# Altium schematic symbol library jlcpcb_2025_04_capacitors_extended_0603.schlib: 3668 symbols (part 14 of 20) (continued)
## CL10F473ZB8NNNC
designator C?  Capacitance: 47nF  (hidden comment: *)
Capacitor, Ceramic (MLCC), 47nF, 50V, Y5V, SMD 0603; Manufacturer: Samsung Electro-Mechanics; Manufacturer Part Number: CL10F473ZB8NNNC; Temperature Rating: -20%~+80%; Package Size: 0603; JLCPCB Basic Part: No; JLCPCB Part Number: C170123; Supplier 1: LCSC; Category: Capacitors - MLCC; Supplier Part Number 1: C170123; Voltage Rating: 50V; Temperature Coefficient: Y5V; RoHS: Yes; ComponentLink1Description: Datasheet; ComponentLink1URL: https://wmsc.lcsc.com/wmsc/upload/file/pdf/v2/lcsc/2304140030_Samsung-Electro-Mechanics-CL10F473ZB8NNNC_C170123.pdf; ComponentLink2Description: JLCPCB Part URL; ComponentLink2URL: https://jlcpcb.com/partdetail/C170123; ComponentLink3Description: LCSC Part URL; ComponentLink3URL: https://lcsc.com/product-detail/Multilayer-Ceramic-Capacitors-MLCC---SMD-SMT_Samsung-Electro-Mechanics-Samsung-Electro-Mechanics-CL10F473ZB8NNNC_C170123.html; ComponentLink4Description: Samsung Component Library; ComponentLink4URL: https://weblib.samsungsem.com/mlcc/mlcc-ec.do?partNumber=CL10F473ZB8NNN
footprint CAP-0603 (0603 (1608M) Capacitor)
pins: 1, 2

## CL10F474ZA8NNNC
designator C?  Capacitance: 470nF  (hidden comment: *)
Capacitor, Ceramic (MLCC), 470nF, 25V, Y5V, SMD 0603; Manufacturer: Samsung Electro-Mechanics; Manufacturer Part Number: CL10F474ZA8NNNC; Temperature Rating: -20%~+80%; Package Size: 0603; JLCPCB Basic Part: No; JLCPCB Part Number: C318649; Supplier 1: LCSC; Category: Capacitors - MLCC; Supplier Part Number 1: C318649; Voltage Rating: 25V; Temperature Coefficient: Y5V; RoHS: Yes; ComponentLink1Description: Datasheet; ComponentLink1URL: https://wmsc.lcsc.com/wmsc/upload/file/pdf/v2/lcsc/1912111437_Samsung-Electro-Mechanics-CL10F474ZA8NNNC_C318649.pdf; ComponentLink2Description: JLCPCB Part URL; ComponentLink2URL: https://jlcpcb.com/partdetail/C318649; ComponentLink3Description: LCSC Part URL; ComponentLink3URL: https://lcsc.com/product-detail/Multilayer-Ceramic-Capacitors-MLCC---SMD-SMT_Samsung-Electro-Mechanics-Samsung-Electro-Mechanics-CL10F474ZA8NNNC_C318649.html; ComponentLink4Description: Samsung Component Library; ComponentLink4URL: https://weblib.samsungsem.com/mlcc/mlcc-ec.do?partNumber=CL10F474ZA8NNN
footprint CAP-0603 (0603 (1608M) Capacitor)
pins: 1, 2

## CL10F474ZB8NNNC
designator C?  Capacitance: 470nF  (hidden comment: *)
Capacitor, Ceramic (MLCC), 470nF, 50V, Y5V, SMD 0603; Manufacturer: Samsung Electro-Mechanics; Manufacturer Part Number: CL10F474ZB8NNNC; Temperature Rating: -20%~+80%; Package Size: 0603; JLCPCB Basic Part: No; JLCPCB Part Number: C296719; Supplier 1: LCSC; Category: Capacitors - MLCC; Supplier Part Number 1: C296719; Voltage Rating: 50V; Temperature Coefficient: Y5V; RoHS: Yes; ComponentLink1Description: Datasheet; ComponentLink1URL: https://wmsc.lcsc.com/wmsc/upload/file/pdf/v2/lcsc/2304140030_Samsung-Electro-Mechanics-CL10F474ZB8NNNC_C296719.pdf; ComponentLink2Description: JLCPCB Part URL; ComponentLink2URL: https://jlcpcb.com/partdetail/C296719; ComponentLink3Description: LCSC Part URL; ComponentLink3URL: https://lcsc.com/product-detail/Multilayer-Ceramic-Capacitors-MLCC---SMD-SMT_Samsung-Electro-Mechanics-Samsung-Electro-Mechanics-CL10F474ZB8NNNC_C296719.html; ComponentLink4Description: Samsung Component Library; ComponentLink4URL: https://weblib.samsungsem.com/mlcc/mlcc-ec.do?partNumber=CL10F474ZB8NNN
footprint CAP-0603 (0603 (1608M) Capacitor)
pins: 1, 2

## CL10F474ZO8NNNC
designator C?  Capacitance: 470nF  (hidden comment: *)
Capacitor, Ceramic (MLCC), 470nF, 16V, Y5V, SMD 0603; Manufacturer: Samsung Electro-Mechanics; Manufacturer Part Number: CL10F474ZO8NNNC; Temperature Rating: -20%~+80%; Package Size: 0603; JLCPCB Basic Part: No; JLCPCB Part Number: C318652; Supplier 1: LCSC; Category: Capacitors - MLCC; Supplier Part Number 1: C318652; Voltage Rating: 16V; Temperature Coefficient: Y5V; RoHS: Yes; ComponentLink1Description: Datasheet; ComponentLink1URL: https://wmsc.lcsc.com/wmsc/upload/file/pdf/v2/lcsc/2304140030_Samsung-Electro-Mechanics-CL10F474ZO8NNNC_C318652.pdf; ComponentLink2Description: JLCPCB Part URL; ComponentLink2URL: https://jlcpcb.com/partdetail/C318652; ComponentLink3Description: LCSC Part URL; ComponentLink3URL: https://lcsc.com/product-detail/Multilayer-Ceramic-Capacitors-MLCC---SMD-SMT_Samsung-Electro-Mechanics-Samsung-Electro-Mechanics-CL10F474ZO8NNNC_C318652.html; ComponentLink4Description: Samsung Component Library; ComponentLink4URL: https://weblib.samsungsem.com/mlcc/mlcc-ec.do?partNumber=CL10F474ZO8NNN
footprint CAP-0603 (0603 (1608M) Capacitor)
pins: 1, 2

## CL10X105KO8NNPC
designator C?  Capacitance: 1uF  (hidden comment: *)
Capacitor, Ceramic (MLCC), 1uF, ±10%, 16V, X6S, ±10%, SMD 0603; Manufacturer: Samsung Electro-Mechanics; Manufacturer Part Number: CL10X105KO8NNPC; Package Size: 0603; JLCPCB Basic Part: No; JLCPCB Part Number: C307514; Supplier 1: LCSC; Category: Capacitors - MLCC; Supplier Part Number 1: C307514; Tolerance: ±10%; Voltage Rating: 16V; Temperature Coefficient: X6S; RoHS: Yes; ComponentLink1Description: Datasheet; ComponentLink1URL: https://wmsc.lcsc.com/wmsc/upload/file/pdf/v2/lcsc/2304140030_Samsung-Electro-Mechanics-CL10X105KO8NNPC_C307514.pdf; ComponentLink2Description: JLCPCB Part URL; ComponentLink2URL: https://jlcpcb.com/partdetail/C307514; ComponentLink3Description: LCSC Part URL; ComponentLink3URL: https://lcsc.com/product-detail/Multilayer-Ceramic-Capacitors-MLCC---SMD-SMT_Samsung-Electro-Mechanics-Samsung-Electro-Mechanics-CL10X105KO8NNPC_C307514.html; ComponentLink4Description: Samsung Component Library; ComponentLink4URL: https://weblib.samsungsem.com/mlcc/mlcc-ec.do?partNumber=CL10X105KO8NNP
footprint CAP-0603 (0603 (1608M) Capacitor)
pins: 1, 2

## CL10X106MO8NRNC
designator C?  Capacitance: 10uF  (hidden comment: *)
Capacitor, Ceramic (MLCC), 10uF, 16V, X6S, SMD 0603; Manufacturer: Samsung Electro-Mechanics; Manufacturer Part Number: CL10X106MO8NRNC; Package Size: 0603; JLCPCB Basic Part: No; JLCPCB Part Number: C3039688; Supplier 1: LCSC; Category: Capacitors - MLCC; Supplier Part Number 1: C3039688; Voltage Rating: 16V; Temperature Coefficient: X6S; RoHS: Yes; ComponentLink1Description: Datasheet; ComponentLink1URL: https://wmsc.lcsc.com/wmsc/upload/file/pdf/v2/lcsc/2206222030_Samsung-Electro-Mechanics-CL10X106MO8NRNC_C3039688.pdf; ComponentLink2Description: JLCPCB Part URL; ComponentLink2URL: https://jlcpcb.com/partdetail/C3039688; ComponentLink3Description: LCSC Part URL; ComponentLink3URL: https://lcsc.com/product-detail/Multilayer-Ceramic-Capacitors-MLCC---SMD-SMT_Samsung-Electro-Mechanics-Samsung-Electro-Mechanics-CL10X106MO8NRNC_C3039688.html; ComponentLink4Description: Samsung Component Library; ComponentLink4URL: https://weblib.samsungsem.com/mlcc/mlcc-ec.do?partNumber=CL10X106MO8NRN
footprint CAP-0603 (0603 (1608M) Capacitor)
pins: 1, 2

## CL10X106MP8NRNC
designator C?  Capacitance: 10uF  (hidden comment: *)
Capacitor, Ceramic (MLCC), 10uF, ±20%, 10V, X6S, ±20%, SMD 0603; Manufacturer: Samsung Electro-Mechanics; Manufacturer Part Number: CL10X106MP8NRNC; Package Size: 0603; JLCPCB Basic Part: No; JLCPCB Part Number: C318633; Supplier 1: LCSC; Category: Capacitors - MLCC; Supplier Part Number 1: C318633; Tolerance: ±20%; Voltage Rating: 10V; Temperature Coefficient: X6S; RoHS: Yes; ComponentLink1Description: Datasheet; ComponentLink1URL: https://wmsc.lcsc.com/wmsc/upload/file/pdf/v2/lcsc/1912111437_Samsung-Electro-Mechanics-CL10X106MP8NRNC_C318633.pdf; ComponentLink2Description: JLCPCB Part URL; ComponentLink2URL: https://jlcpcb.com/partdetail/C318633; ComponentLink3Description: LCSC Part URL; ComponentLink3URL: https://lcsc.com/product-detail/Multilayer-Ceramic-Capacitors-MLCC---SMD-SMT_Samsung-Electro-Mechanics-Samsung-Electro-Mechanics-CL10X106MP8NRNC_C318633.html; ComponentLink4Description: Samsung Component Library; ComponentLink4URL: https://weblib.samsungsem.com/mlcc/mlcc-ec.do?partNumber=CL10X106MP8NRN
footprint CAP-0603 (0603 (1608M) Capacitor)
pins: 1, 2

## CL10X106MQ8NNNC
designator C?  Capacitance: 10uF  (hidden comment: *)
Capacitor, Ceramic (MLCC), 10uF, ±20%, 6.3V, X6S, ±20%, SMD 0603; Manufacturer: Samsung Electro-Mechanics; Manufacturer Part Number: CL10X106MQ8NNNC; Package Size: 0603; JLCPCB Basic Part: No; JLCPCB Part Number: C318634; Supplier 1: LCSC; Category: Capacitors - MLCC; Supplier Part Number 1: C318634; Tolerance: ±20%; Voltage Rating: 6.3V; Temperature Coefficient: X6S; RoHS: Yes; ComponentLink1Description: Datasheet; ComponentLink2Description: JLCPCB Part URL; ComponentLink2URL: https://jlcpcb.com/partdetail/C318634; ComponentLink3Description: LCSC Part URL; ComponentLink3URL: https://lcsc.com/product-detail/Multilayer-Ceramic-Capacitors-MLCC---SMD-SMT_Samsung-Electro-Mechanics-Samsung-Electro-Mechanics-CL10X106MQ8NNNC_C318634.html; ComponentLink4Description: Samsung Component Library; ComponentLink4URL: https://weblib.samsungsem.com/mlcc/mlcc-ec.do?partNumber=CL10X106MQ8NNN
footprint CAP-0603 (0603 (1608M) Capacitor)
pins: 1, 2

## CL10X106MR8NNNC
designator C?  Capacitance: 10uF  (hidden comment: *)
Capacitor, Ceramic (MLCC), 10uF, ±20%, 4V, X6S, ±20%, SMD 0603; Manufacturer: Samsung Electro-Mechanics; Manufacturer Part Number: CL10X106MR8NNNC; Package Size: 0603; JLCPCB Basic Part: No; JLCPCB Part Number: C318635; Supplier 1: LCSC; Category: Capacitors - MLCC; Supplier Part Number 1: C318635; Tolerance: ±20%; Voltage Rating: 4V; Temperature Coefficient: X6S; RoHS: Yes; ComponentLink1Description: Datasheet; ComponentLink1URL: https://wmsc.lcsc.com/wmsc/upload/file/pdf/v2/lcsc/2304140030_Samsung-Electro-Mechanics-CL10X106MR8NNNC_C318635.pdf; ComponentLink2Description: JLCPCB Part URL; ComponentLink2URL: https://jlcpcb.com/partdetail/C318635; ComponentLink3Description: LCSC Part URL; ComponentLink3URL: https://lcsc.com/product-detail/Multilayer-Ceramic-Capacitors-MLCC---SMD-SMT_Samsung-Electro-Mechanics-Samsung-Electro-Mechanics-CL10X106MR8NNNC_C318635.html; ComponentLink4Description: Samsung Component Library; ComponentLink4URL: https://weblib.samsungsem.com/mlcc/mlcc-ec.do?partNumber=CL10X106MR8NNN
footprint CAP-0603 (0603 (1608M) Capacitor)
pins: 1, 2

## CL10X226MQ8QRWC
designator C?  Capacitance: 22uF  (hidden comment: *)
Capacitor, Ceramic (MLCC), 22uF, ±20%, 6.3V, X6S, ±20%, SMD 0603; Manufacturer: Samsung Electro-Mechanics; Manufacturer Part Number: CL10X226MQ8QRWC; Package Size: 0603; JLCPCB Basic Part: No; JLCPCB Part Number: C2991805; Supplier 1: LCSC; Category: Capacitors - MLCC; Supplier Part Number 1: C2991805; Tolerance: ±20%; Voltage Rating: 6.3V; Temperature Coefficient: X6S; RoHS: Yes; ComponentLink1Description: Datasheet; ComponentLink1URL: https://wmsc.lcsc.com/wmsc/upload/file/pdf/v2/lcsc/2204111645_Samsung-Electro-Mechanics-CL10X226MQ8QRWC_C2991805.pdf; ComponentLink2Description: JLCPCB Part URL; ComponentLink2URL: https://jlcpcb.com/partdetail/C2991805; ComponentLink3Description: LCSC Part URL; ComponentLink3URL: https://lcsc.com/product-detail/Multilayer-Ceramic-Capacitors-MLCC---SMD-SMT_Samsung-Electro-Mechanics-Samsung-Electro-Mechanics-CL10X226MQ8QRWC_C2991805.html; ComponentLink4Description: Samsung Component Library; ComponentLink4URL: https://weblib.samsungsem.com/mlcc/mlcc-ec.do?partNumber=CL10X226MQ8QRW
footprint CAP-0603 (0603 (1608M) Capacitor)
pins: 1, 2

## CL10X475KQ8NNNC
designator C?  Capacitance: 4.7uF  (hidden comment: *)
Capacitor, Ceramic (MLCC), 4.7uF, ±10%, 6.3V, X6S, ±10%, SMD 0603; Manufacturer: Samsung Electro-Mechanics; Manufacturer Part Number: CL10X475KQ8NNNC; Package Size: 0603; JLCPCB Basic Part: No; JLCPCB Part Number: C307516; Supplier 1: LCSC; Category: Capacitors - MLCC; Supplier Part Number 1: C307516; Tolerance: ±10%; Voltage Rating: 6.3V; Temperature Coefficient: X6S; RoHS: Yes; ComponentLink1Description: Datasheet; ComponentLink1URL: https://wmsc.lcsc.com/wmsc/upload/file/pdf/v2/lcsc/2304140030_Samsung-Electro-Mechanics-CL10X475KQ8NNNC_C307516.pdf; ComponentLink2Description: JLCPCB Part URL; ComponentLink2URL: https://jlcpcb.com/partdetail/C307516; ComponentLink3Description: LCSC Part URL; ComponentLink3URL: https://lcsc.com/product-detail/Multilayer-Ceramic-Capacitors-MLCC---SMD-SMT_Samsung-Electro-Mechanics-Samsung-Electro-Mechanics-CL10X475KQ8NNNC_C307516.html; ComponentLink4Description: Samsung Component Library; ComponentLink4URL: https://weblib.samsungsem.com/mlcc/mlcc-ec.do?partNumber=CL10X475KQ8NNN
footprint CAP-0603 (0603 (1608M) Capacitor)
pins: 1, 2

## CL10Y225KP84PNC
designator C?  Capacitance: 2.2uF  (hidden comment: *)
Capacitor, Ceramic (MLCC), 2.2uF, ±10%, 10V, X7S, ±10%, SMD 0603; Manufacturer: Samsung Electro-Mechanics; Manufacturer Part Number: CL10Y225KP84PNC; Package Size: 0603; JLCPCB Basic Part: No; JLCPCB Part Number: C472804; Supplier 1: LCSC; Category: Capacitors - MLCC; Supplier Part Number 1: C472804; Tolerance: ±10%; Voltage Rating: 10V; Temperature Coefficient: X7S; RoHS: Yes; ComponentLink1Description: Datasheet; ComponentLink1URL: https://wmsc.lcsc.com/wmsc/upload/file/pdf/v2/lcsc/2304140030_Samsung-Electro-Mechanics-CL10Y225KP84PNC_C472804.pdf; ComponentLink2Description: JLCPCB Part URL; ComponentLink2URL: https://jlcpcb.com/partdetail/C472804; ComponentLink3Description: LCSC Part URL; ComponentLink3URL: https://lcsc.com/product-detail/Multilayer-Ceramic-Capacitors-MLCC---SMD-SMT_Samsung-Electro-Mechanics-Samsung-Electro-Mechanics-CL10Y225KP84PNC_C472804.html; ComponentLink4Description: Samsung Component Library; ComponentLink4URL: https://weblib.samsungsem.com/mlcc/mlcc-ec.do?partNumber=CL10Y225KP84PN
footprint CAP-0603 (0603 (1608M) Capacitor)
pins: 1, 2

## CM105X5R476M06AT
designator C?  Capacitance: 47000000pF  (hidden comment: *)
Capacitor, Ceramic (MLCC), 47000000pF, ±20%, 6.3V, X5R, ±20%, SMD 0603; Manufacturer: Kyocera AVX; Manufacturer Part Number: CM105X5R476M06AT; Package Size: 0603; JLCPCB Basic Part: No; JLCPCB Part Number: C3038125; Supplier 1: LCSC; Category: Capacitors - MLCC; Supplier Part Number 1: C3038125; Tolerance: ±20%; Voltage Rating: 6.3V; Temperature Coefficient: X5R; RoHS: Yes; ComponentLink1Description: Datasheet; ComponentLink1URL: https://wmsc.lcsc.com/wmsc/upload/file/pdf/v2/lcsc/2206161801_Kyocera-AVX-CM105X5R476M06AT_C3038125.pdf; ComponentLink2Description: JLCPCB Part URL; ComponentLink2URL: https://jlcpcb.com/partdetail/C3038125; ComponentLink3Description: LCSC Part URL; ComponentLink3URL: https://lcsc.com/product-detail/Multilayer-Ceramic-Capacitors-MLCC---SMD-SMT_Kyocera-AVX-Kyocera-AVX-CM105X5R476M06AT_C3038125.html
footprint CAP-0603 (0603 (1608M) Capacitor)
pins: 1, 2

## CS0603KRX7R9BB101
designator C?  Capacitance: 100pF  (hidden comment: *)
Capacitor, Ceramic (MLCC), 100pF, ±10%, 50V, X7R, ±10%, SMD 0603; Manufacturer: YAGEO; Manufacturer Part Number: CS0603KRX7R9BB101; Package Size: 0603; JLCPCB Basic Part: No; JLCPCB Part Number: C577420; Supplier 1: LCSC; Category: Capacitors - MLCC; Supplier Part Number 1: C577420; Tolerance: ±10%; Voltage Rating: 50V; Temperature Coefficient: X7R; RoHS: Yes; ComponentLink1Description: Datasheet; ComponentLink1URL: https://wmsc.lcsc.com/wmsc/upload/file/pdf/v2/lcsc/2209231730_YAGEO-CS0603KRX7R9BB101_C577420.pdf; ComponentLink2Description: JLCPCB Part URL; ComponentLink2URL: https://jlcpcb.com/partdetail/C577420; ComponentLink3Description: LCSC Part URL; ComponentLink3URL: https://lcsc.com/product-detail/Multilayer-Ceramic-Capacitors-MLCC---SMD-SMT_YAGEO-YAGEO-CS0603KRX7R9BB101_C577420.html
footprint CAP-0603 (0603 (1608M) Capacitor)
pins: 1, 2

## CS0603KRX7R9BB103
designator C?  Capacitance: 10nF  (hidden comment: *)
Capacitor, Ceramic (MLCC), 10nF, ±10%, 50V, X7R, ±10%, SMD 0603; Manufacturer: YAGEO; Manufacturer Part Number: CS0603KRX7R9BB103; Package Size: 0603; JLCPCB Basic Part: No; JLCPCB Part Number: C327191; Supplier 1: LCSC; Category: Capacitors - MLCC; Supplier Part Number 1: C327191; Tolerance: ±10%; Voltage Rating: 50V; Temperature Coefficient: X7R; RoHS: Yes; ComponentLink1Description: Datasheet; ComponentLink1URL: https://wmsc.lcsc.com/wmsc/upload/file/pdf/v2/lcsc/1811141226_YAGEO-CS0603KRX7R9BB103_C327191.pdf; ComponentLink2Description: JLCPCB Part URL; ComponentLink2URL: https://jlcpcb.com/partdetail/C327191; ComponentLink3Description: LCSC Part URL; ComponentLink3URL: https://lcsc.com/product-detail/Multilayer-Ceramic-Capacitors-MLCC---SMD-SMT_YAGEO-YAGEO-CS0603KRX7R9BB103_C327191.html
footprint CAP-0603 (0603 (1608M) Capacitor)
pins: 1, 2

## CS0603KRX7R9BB104
designator C?  Capacitance: 100nF  (hidden comment: *)
Capacitor, Ceramic (MLCC), 100nF, ±10%, 50V, X7R, ±10%, SMD 0603; Manufacturer: YAGEO; Manufacturer Part Number: CS0603KRX7R9BB104; Package Size: 0603; JLCPCB Basic Part: No; JLCPCB Part Number: C577422; Supplier 1: LCSC; Category: Capacitors - MLCC; Supplier Part Number 1: C577422; Tolerance: ±10%; Voltage Rating: 50V; Temperature Coefficient: X7R; RoHS: Yes; ComponentLink1Description: Datasheet; ComponentLink1URL: https://wmsc.lcsc.com/wmsc/upload/file/pdf/v2/lcsc/2204021130_YAGEO-CS0603KRX7R9BB104_C577422.pdf; ComponentLink2Description: JLCPCB Part URL; ComponentLink2URL: https://jlcpcb.com/partdetail/C577422; ComponentLink3Description: LCSC Part URL; ComponentLink3URL: https://lcsc.com/product-detail/Multilayer-Ceramic-Capacitors-MLCC---SMD-SMT_YAGEO-YAGEO-CS0603KRX7R9BB104_C577422.html
footprint CAP-0603 (0603 (1608M) Capacitor)
pins: 1, 2

## CS0603KRX7R9BB222
designator C?  Capacitance: 2.2nF  (hidden comment: *)
Capacitor, Ceramic (MLCC), 2.2nF, ±10%, 50V, X7R, ±10%, SMD 0603; Manufacturer: YAGEO; Manufacturer Part Number: CS0603KRX7R9BB222; Package Size: 0603; JLCPCB Basic Part: No; JLCPCB Part Number: C309517; Supplier 1: LCSC; Category: Capacitors - MLCC; Supplier Part Number 1: C309517; Tolerance: ±10%; Voltage Rating: 50V; Temperature Coefficient: X7R; RoHS: Yes; ComponentLink1Description: Datasheet; ComponentLink1URL: https://wmsc.lcsc.com/wmsc/upload/file/pdf/v2/lcsc/2304140030_YAGEO-CS0603KRX7R9BB222_C309517.pdf; ComponentLink2Description: JLCPCB Part URL; ComponentLink2URL: https://jlcpcb.com/partdetail/C309517; ComponentLink3Description: LCSC Part URL; ComponentLink3URL: https://lcsc.com/product-detail/Multilayer-Ceramic-Capacitors-MLCC---SMD-SMT_YAGEO-YAGEO-CS0603KRX7R9BB222_C309517.html
footprint CAP-0603 (0603 (1608M) Capacitor)
pins: 1, 2

## CS0603KRX7R9BB332
designator C?  Capacitance: 3.3nF  (hidden comment: *)
Capacitor, Ceramic (MLCC), 3.3nF, ±10%, 50V, X7R, ±10%, SMD 0603; Manufacturer: YAGEO; Manufacturer Part Number: CS0603KRX7R9BB332; Package Size: 0603; JLCPCB Basic Part: No; JLCPCB Part Number: C309518; Supplier 1: LCSC; Category: Capacitors - MLCC; Supplier Part Number 1: C309518; Tolerance: ±10%; Voltage Rating: 50V; Temperature Coefficient: X7R; RoHS: Yes; ComponentLink1Description: Datasheet; ComponentLink1URL: https://wmsc.lcsc.com/wmsc/upload/file/pdf/v2/lcsc/1811081329_YAGEO-CS0603KRX7R9BB332_C309518.pdf; ComponentLink2Description: JLCPCB Part URL; ComponentLink2URL: https://jlcpcb.com/partdetail/C309518; ComponentLink3Description: LCSC Part URL; ComponentLink3URL: https://lcsc.com/product-detail/Multilayer-Ceramic-Capacitors-MLCC---SMD-SMT_YAGEO-YAGEO-CS0603KRX7R9BB332_C309518.html
footprint CAP-0603 (0603 (1608M) Capacitor)
pins: 1, 2

## CS1608X5R105K160NRB
designator C?  Capacitance: 1uF  (hidden comment: *)
Capacitor, Ceramic (MLCC), 1uF, ±10%, 16V, X5R, ±10%, SMD 0603; Manufacturer: Samwha Capacitor; Manufacturer Part Number: CS1608X5R105K160NRB; Package Size: 0603; JLCPCB Basic Part: No; JLCPCB Part Number: C2909629; Supplier 1: LCSC; Category: Capacitors - MLCC; Supplier Part Number 1: C2909629; Tolerance: ±10%; Voltage Rating: 16V; Temperature Coefficient: X5R; RoHS: Yes; ComponentLink1Description: Datasheet; ComponentLink1URL: https://wmsc.lcsc.com/wmsc/upload/file/pdf/v2/lcsc/2110272130_Samwha-Capacitor-CS1608X5R105K160NRB_C2909629.pdf; ComponentLink2Description: JLCPCB Part URL; ComponentLink2URL: https://jlcpcb.com/partdetail/C2909629; ComponentLink3Description: LCSC Part URL; ComponentLink3URL: https://lcsc.com/product-detail/Multilayer-Ceramic-Capacitors-MLCC---SMD-SMT_Samwha-Capacitor-Samwha-Capacitor-CS1608X5R105K160NRB_C2909629.html
footprint CAP-0603 (0603 (1608M) Capacitor)
pins: 1, 2

## CS1608X5R105K250NRB
designator C?  Capacitance: 1uF  (hidden comment: *)
Capacitor, Ceramic (MLCC), 1uF, ±10%, 25V, X5R, ±10%, SMD 0603; Manufacturer: Samwha Capacitor; Manufacturer Part Number: CS1608X5R105K250NRB; Package Size: 0603; JLCPCB Basic Part: No; JLCPCB Part Number: C2918486; Supplier 1: LCSC; Category: Capacitors - MLCC; Supplier Part Number 1: C2918486; Tolerance: ±10%; Voltage Rating: 25V; Temperature Coefficient: X5R; RoHS: Yes; ComponentLink1Description: Datasheet; ComponentLink1URL: https://wmsc.lcsc.com/wmsc/upload/file/pdf/v2/lcsc/2111172030_Samwha-Capacitor-CS1608X5R105K250NRB_C2918486.pdf; ComponentLink2Description: JLCPCB Part URL; ComponentLink2URL: https://jlcpcb.com/partdetail/C2918486; ComponentLink3Description: LCSC Part URL; ComponentLink3URL: https://lcsc.com/product-detail/Multilayer-Ceramic-Capacitors-MLCC---SMD-SMT_Samwha-Capacitor-Samwha-Capacitor-CS1608X5R105K250NRB_C2918486.html
footprint CAP-0603 (0603 (1608M) Capacitor)
pins: 1, 2

## CS1608X5R106M160NRB
designator C?  Capacitance: 10uF  (hidden comment: *)
Capacitor, Ceramic (MLCC), 10uF, ±20%, 16V, X5R, ±20%, SMD 0603; Manufacturer: Samwha Capacitor; Manufacturer Part Number: CS1608X5R106M160NRB; Package Size: 0603; JLCPCB Basic Part: No; JLCPCB Part Number: C2909630; Supplier 1: LCSC; Category: Capacitors - MLCC; Supplier Part Number 1: C2909630; Tolerance: ±20%; Voltage Rating: 16V; Temperature Coefficient: X5R; RoHS: Yes; ComponentLink1Description: Datasheet; ComponentLink1URL: https://wmsc.lcsc.com/wmsc/upload/file/pdf/v2/lcsc/2110272130_Samwha-Capacitor-CS1608X5R106M160NRB_C2909630.pdf; ComponentLink2Description: JLCPCB Part URL; ComponentLink2URL: https://jlcpcb.com/partdetail/C2909630; ComponentLink3Description: LCSC Part URL; ComponentLink3URL: https://lcsc.com/product-detail/Multilayer-Ceramic-Capacitors-MLCC---SMD-SMT_Samwha-Capacitor-Samwha-Capacitor-CS1608X5R106M160NRB_C2909630.html
footprint CAP-0603 (0603 (1608M) Capacitor)
pins: 1, 2

## CS1608X7R104K500NRB
designator C?  Capacitance: 100nF  (hidden comment: *)
Capacitor, Ceramic (MLCC), 100nF, 50V, X7R, SMD 0603; Manufacturer: Samwha Capacitor; Manufacturer Part Number: CS1608X7R104K500NRB; Package Size: 0603; JLCPCB Basic Part: No; JLCPCB Part Number: C2909627; Supplier 1: LCSC; Category: Capacitors - MLCC; Supplier Part Number 1: C2909627; Voltage Rating: 50V; Temperature Coefficient: X7R; RoHS: Yes; ComponentLink1Description: Datasheet; ComponentLink1URL: https://wmsc.lcsc.com/wmsc/upload/file/pdf/v2/lcsc/2110272130_Samwha-Capacitor-CS1608X7R104K500NRB_C2909627.pdf; ComponentLink2Description: JLCPCB Part URL; ComponentLink2URL: https://jlcpcb.com/partdetail/C2909627; ComponentLink3Description: LCSC Part URL; ComponentLink3URL: https://lcsc.com/product-detail/Multilayer-Ceramic-Capacitors-MLCC---SMD-SMT_Samwha-Capacitor-Samwha-Capacitor-CS1608X7R104K500NRB_C2909627.html
footprint CAP-0603 (0603 (1608M) Capacitor)
pins: 1, 2

## CS1608X7R105K160NRB
designator C?  Capacitance: 1uF  (hidden comment: *)
Capacitor, Ceramic (MLCC), 1uF, 16V, X7R, SMD 0603; Manufacturer: Samwha Capacitor; Manufacturer Part Number: CS1608X7R105K160NRB; Package Size: 0603; JLCPCB Basic Part: No; JLCPCB Part Number: C2918499; Supplier 1: LCSC; Category: Capacitors - MLCC; Supplier Part Number 1: C2918499; Voltage Rating: 16V; Temperature Coefficient: X7R; RoHS: Yes; ComponentLink1Description: Datasheet; ComponentLink1URL: https://wmsc.lcsc.com/wmsc/upload/file/pdf/v2/lcsc/2111172030_Samwha-Capacitor-CS1608X7R105K160NRB_C2918499.pdf; ComponentLink2Description: JLCPCB Part URL; ComponentLink2URL: https://jlcpcb.com/partdetail/C2918499; ComponentLink3Description: LCSC Part URL; ComponentLink3URL: https://lcsc.com/product-detail/Multilayer-Ceramic-Capacitors-MLCC---SMD-SMT_Samwha-Capacitor-Samwha-Capacitor-CS1608X7R105K160NRB_C2918499.html
footprint CAP-0603 (0603 (1608M) Capacitor)
pins: 1, 2

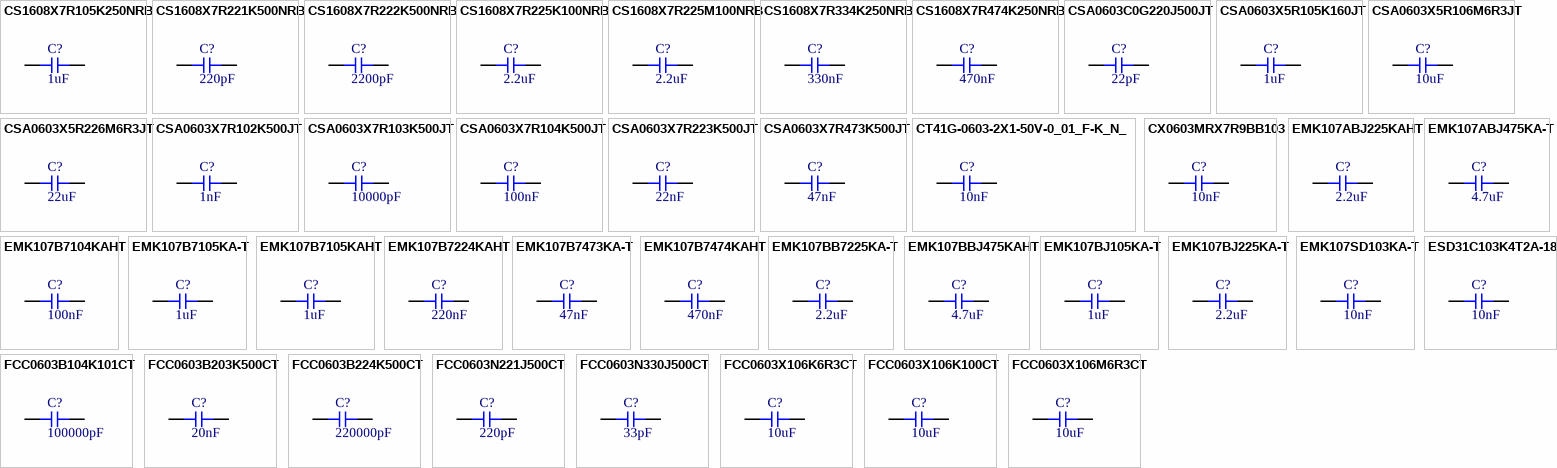
[diagram p62: symbols CS1608X7R105K250NRB to FCC0603X106M6R3CT]

## CS1608X7R105K250NRB
designator C?  Capacitance: 1uF  (hidden comment: *)
Capacitor, Ceramic (MLCC), 1uF, ±10%, 25V, X7R, ±10%, SMD 0603; Manufacturer: Samwha Capacitor; Manufacturer Part Number: CS1608X7R105K250NRB; Package Size: 0603; JLCPCB Basic Part: No; JLCPCB Part Number: C513775; Supplier 1: LCSC; Category: Capacitors - MLCC; Supplier Part Number 1: C513775; Tolerance: ±10%; Voltage Rating: 25V; Temperature Coefficient: X7R; RoHS: Yes; ComponentLink1Description: Datasheet; ComponentLink1URL: https://wmsc.lcsc.com/wmsc/upload/file/pdf/v2/lcsc/2005192033_Samwha-Capacitor-CS1608X7R105K250NRB_C513775.pdf; ComponentLink2Description: JLCPCB Part URL; ComponentLink2URL: https://jlcpcb.com/partdetail/C513775; ComponentLink3Description: LCSC Part URL; ComponentLink3URL: https://lcsc.com/product-detail/Multilayer-Ceramic-Capacitors-MLCC---SMD-SMT_Samwha-Capacitor-Samwha-Capacitor-CS1608X7R105K250NRB_C513775.html
footprint CAP-0603 (0603 (1608M) Capacitor)
pins: 1, 2

## CS1608X7R221K500NRB
designator C?  Capacitance: 220pF  (hidden comment: *)
Capacitor, Ceramic (MLCC), 220pF, ±10%, null, X7R, ±10%, SMD 0603; Manufacturer: Samwha Capacitor; Manufacturer Part Number: CS1608X7R221K500NRB; Package Size: 0603; JLCPCB Basic Part: No; JLCPCB Part Number: C5255295; Supplier 1: LCSC; Category: Capacitors - MLCC; Supplier Part Number 1: C5255295; Tolerance: ±10%; Voltage Rating: null; Temperature Coefficient: X7R; RoHS: Yes; ComponentLink1Description: Datasheet; ComponentLink1URL: https://wmsc.lcsc.com/wmsc/upload/file/pdf/v2/lcsc/2211101800_Samwha-Capacitor-CS1608X7R221K500NRB_C5255295.pdf; ComponentLink2Description: JLCPCB Part URL; ComponentLink2URL: https://jlcpcb.com/partdetail/C5255295; ComponentLink3Description: LCSC Part URL; ComponentLink3URL: https://lcsc.com/product-detail/Multilayer-Ceramic-Capacitors-MLCC---SMD-SMT_Samwha-Capacitor-Samwha-Capacitor-CS1608X7R221K500NRB_C5255295.html
footprint CAP-0603 (0603 (1608M) Capacitor)
pins: 1, 2

## CS1608X7R222K500NRB
designator C?  Capacitance: 2200pF  (hidden comment: *)
Capacitor, Ceramic (MLCC), 2200pF, ±10%, null, X7R, ±10%, SMD 0603; Manufacturer: Samwha Capacitor; Manufacturer Part Number: CS1608X7R222K500NRB; Package Size: 0603; JLCPCB Basic Part: No; JLCPCB Part Number: C5255296; Supplier 1: LCSC; Category: Capacitors - MLCC; Supplier Part Number 1: C5255296; Tolerance: ±10%; Voltage Rating: null; Temperature Coefficient: X7R; RoHS: Yes; ComponentLink1Description: Datasheet; ComponentLink1URL: https://wmsc.lcsc.com/wmsc/upload/file/pdf/v2/lcsc/2211101800_Samwha-Capacitor-CS1608X7R222K500NRB_C5255296.pdf; ComponentLink2Description: JLCPCB Part URL; ComponentLink2URL: https://jlcpcb.com/partdetail/C5255296; ComponentLink3Description: LCSC Part URL; ComponentLink3URL: https://lcsc.com/product-detail/Multilayer-Ceramic-Capacitors-MLCC---SMD-SMT_Samwha-Capacitor-Samwha-Capacitor-CS1608X7R222K500NRB_C5255296.html
footprint CAP-0603 (0603 (1608M) Capacitor)
pins: 1, 2

## CS1608X7R225K100NRB
designator C?  Capacitance: 2.2uF  (hidden comment: *)
Capacitor, Ceramic (MLCC), 2.2uF, ±10%, 10V, X7R, ±10%, SMD 0603; Manufacturer: Samwha Capacitor; Manufacturer Part Number: CS1608X7R225K100NRB; Package Size: 0603; JLCPCB Basic Part: No; JLCPCB Part Number: C516003; Supplier 1: LCSC; Category: Capacitors - MLCC; Supplier Part Number 1: C516003; Tolerance: ±10%; Voltage Rating: 10V; Temperature Coefficient: X7R; RoHS: Yes; ComponentLink1Description: Datasheet; ComponentLink1URL: https://wmsc.lcsc.com/wmsc/upload/file/pdf/v2/lcsc/2304140030_Samwha-Capacitor-CS1608X7R225K100NRB_C516003.pdf; ComponentLink2Description: JLCPCB Part URL; ComponentLink2URL: https://jlcpcb.com/partdetail/C516003; ComponentLink3Description: LCSC Part URL; ComponentLink3URL: https://lcsc.com/product-detail/Multilayer-Ceramic-Capacitors-MLCC---SMD-SMT_Samwha-Capacitor-Samwha-Capacitor-CS1608X7R225K100NRB_C516003.html
footprint CAP-0603 (0603 (1608M) Capacitor)
pins: 1, 2

## CS1608X7R225M100NRB
designator C?  Capacitance: 2.2uF  (hidden comment: *)
Capacitor, Ceramic (MLCC), 2.2uF, ±20%, 10V, X7R, ±20%, SMD 0603; Manufacturer: Samwha Capacitor; Manufacturer Part Number: CS1608X7R225M100NRB; Package Size: 0603; JLCPCB Basic Part: No; JLCPCB Part Number: C5189827; Supplier 1: LCSC; Category: Capacitors - MLCC; Supplier Part Number 1: C5189827; Tolerance: ±20%; Voltage Rating: 10V; Temperature Coefficient: X7R; RoHS: Yes; ComponentLink1Description: Datasheet; ComponentLink1URL: https://wmsc.lcsc.com/wmsc/upload/file/pdf/v2/lcsc/2210121101_Samwha-Capacitor-CS1608X7R225M100NRB_C5189827.pdf; ComponentLink2Description: JLCPCB Part URL; ComponentLink2URL: https://jlcpcb.com/partdetail/C5189827; ComponentLink3Description: LCSC Part URL; ComponentLink3URL: https://lcsc.com/product-detail/Multilayer-Ceramic-Capacitors-MLCC---SMD-SMT_Samwha-Capacitor-Samwha-Capacitor-CS1608X7R225M100NRB_C5189827.html
footprint CAP-0603 (0603 (1608M) Capacitor)
pins: 1, 2

## CS1608X7R334K250NRB
designator C?  Capacitance: 330nF  (hidden comment: *)
Capacitor, Ceramic (MLCC), 330nF, 25V, X7R, SMD 0603; Manufacturer: Samwha Capacitor; Manufacturer Part Number: CS1608X7R334K250NRB; Package Size: 0603; JLCPCB Basic Part: No; JLCPCB Part Number: C2918485; Supplier 1: LCSC; Category: Capacitors - MLCC; Supplier Part Number 1: C2918485; Voltage Rating: 25V; Temperature Coefficient: X7R; RoHS: Yes; ComponentLink1Description: Datasheet; ComponentLink1URL: https://wmsc.lcsc.com/wmsc/upload/file/pdf/v2/lcsc/2111172030_Samwha-Capacitor-CS1608X7R334K250NRB_C2918485.pdf; ComponentLink2Description: JLCPCB Part URL; ComponentLink2URL: https://jlcpcb.com/partdetail/C2918485; ComponentLink3Description: LCSC Part URL; ComponentLink3URL: https://lcsc.com/product-detail/Multilayer-Ceramic-Capacitors-MLCC---SMD-SMT_Samwha-Capacitor-Samwha-Capacitor-CS1608X7R334K250NRB_C2918485.html
footprint CAP-0603 (0603 (1608M) Capacitor)
pins: 1, 2

## CS1608X7R474K250NRB
designator C?  Capacitance: 470nF  (hidden comment: *)
Capacitor, Ceramic (MLCC), 470nF, 25V, X7R, SMD 0603; Manufacturer: Samwha Capacitor; Manufacturer Part Number: CS1608X7R474K250NRB; Package Size: 0603; JLCPCB Basic Part: No; JLCPCB Part Number: C2909628; Supplier 1: LCSC; Category: Capacitors - MLCC; Supplier Part Number 1: C2909628; Voltage Rating: 25V; Temperature Coefficient: X7R; RoHS: Yes; ComponentLink1Description: Datasheet; ComponentLink1URL: https://wmsc.lcsc.com/wmsc/upload/file/pdf/v2/lcsc/2110272130_Samwha-Capacitor-CS1608X7R474K250NRB_C2909628.pdf; ComponentLink2Description: JLCPCB Part URL; ComponentLink2URL: https://jlcpcb.com/partdetail/C2909628; ComponentLink3Description: LCSC Part URL; ComponentLink3URL: https://lcsc.com/product-detail/Multilayer-Ceramic-Capacitors-MLCC---SMD-SMT_Samwha-Capacitor-Samwha-Capacitor-CS1608X7R474K250NRB_C2909628.html
footprint CAP-0603 (0603 (1608M) Capacitor)
pins: 1, 2

## CSA0603C0G220J500JT
designator C?  Capacitance: 22pF  (hidden comment: *)
Capacitor, Ceramic (MLCC), 22pF, ±5%, 50V, C0G, ±5%, SMD 0603; Manufacturer: HRE; Manufacturer Part Number: CSA0603C0G220J500JT; Package Size: 0603; JLCPCB Basic Part: No; JLCPCB Part Number: C18220911; Supplier 1: LCSC; Category: Capacitors - MLCC; Supplier Part Number 1: C18220911; Tolerance: ±5%; Voltage Rating: 50V; Temperature Coefficient: C0G; RoHS: Yes; ComponentLink1Description: Datasheet; ComponentLink1URL: https://wmsc.lcsc.com/wmsc/upload/file/pdf/v2/lcsc/2310101733_HRE-CSA0603C0G220J500JT_C18220911.pdf; ComponentLink2Description: JLCPCB Part URL; ComponentLink2URL: https://jlcpcb.com/partdetail/C18220911; ComponentLink3Description: LCSC Part URL; ComponentLink3URL: https://lcsc.com/product-detail/Multilayer-Ceramic-Capacitors-MLCC---SMD-SMT_HRE-HRE-CSA0603C0G220J500JT_C18220911.html
footprint CAP-0603 (0603 (1608M) Capacitor)
pins: 1, 2

## CSA0603X5R105K160JT
designator C?  Capacitance: 1uF  (hidden comment: *)
Capacitor, Ceramic (MLCC), 1uF, ±10%, 16V, X5R, ±10%, SMD 0603; Manufacturer: HRE; Manufacturer Part Number: CSA0603X5R105K160JT; Package Size: 0603; JLCPCB Basic Part: No; JLCPCB Part Number: C3015156; Supplier 1: LCSC; Category: Capacitors - MLCC; Supplier Part Number 1: C3015156; Tolerance: ±10%; Voltage Rating: 16V; Temperature Coefficient: X5R; RoHS: Yes; ComponentLink1Description: Datasheet; ComponentLink1URL: https://wmsc.lcsc.com/wmsc/upload/file/pdf/v2/lcsc/2208051100_HRE-CSA0603X5R105K160JT_C3015156.pdf; ComponentLink2Description: JLCPCB Part URL; ComponentLink2URL: https://jlcpcb.com/partdetail/C3015156; ComponentLink3Description: LCSC Part URL; ComponentLink3URL: https://lcsc.com/product-detail/Multilayer-Ceramic-Capacitors-MLCC---SMD-SMT_HRE-HRE-CSA0603X5R105K160JT_C3015156.html
footprint CAP-0603 (0603 (1608M) Capacitor)
pins: 1, 2

## CSA0603X5R106M6R3JT
designator C?  Capacitance: 10uF  (hidden comment: *)
Capacitor, Ceramic (MLCC), 10uF, ±20%, 6.3V, X5R, ±20%, SMD 0603; Manufacturer: HRE; Manufacturer Part Number: CSA0603X5R106M6R3JT; Package Size: 0603; JLCPCB Basic Part: No; JLCPCB Part Number: C3015157; Supplier 1: LCSC; Category: Capacitors - MLCC; Supplier Part Number 1: C3015157; Tolerance: ±20%; Voltage Rating: 6.3V; Temperature Coefficient: X5R; RoHS: Yes; ComponentLink1Description: Datasheet; ComponentLink1URL: https://wmsc.lcsc.com/wmsc/upload/file/pdf/v2/lcsc/2208051100_HRE-CSA0603X5R106M6R3JT_C3015157.pdf; ComponentLink2Description: JLCPCB Part URL; ComponentLink2URL: https://jlcpcb.com/partdetail/C3015157; ComponentLink3Description: LCSC Part URL; ComponentLink3URL: https://lcsc.com/product-detail/Multilayer-Ceramic-Capacitors-MLCC---SMD-SMT_HRE-HRE-CSA0603X5R106M6R3JT_C3015157.html
footprint CAP-0603 (0603 (1608M) Capacitor)
pins: 1, 2

## CSA0603X5R226M6R3JT
designator C?  Capacitance: 22uF  (hidden comment: *)
Capacitor, Ceramic (MLCC), 22uF, ±20%, 6.3V, X5R, ±20%, SMD 0603; Manufacturer: HRE; Manufacturer Part Number: CSA0603X5R226M6R3JT; Package Size: 0603; JLCPCB Basic Part: No; JLCPCB Part Number: C3015158; Supplier 1: LCSC; Category: Capacitors - MLCC; Supplier Part Number 1: C3015158; Tolerance: ±20%; Voltage Rating: 6.3V; Temperature Coefficient: X5R; RoHS: Yes; ComponentLink1Description: Datasheet; ComponentLink1URL: https://wmsc.lcsc.com/wmsc/upload/file/pdf/v2/lcsc/2208051100_HRE-CSA0603X5R226M6R3JT_C3015158.pdf; ComponentLink2Description: JLCPCB Part URL; ComponentLink2URL: https://jlcpcb.com/partdetail/C3015158; ComponentLink3Description: LCSC Part URL; ComponentLink3URL: https://lcsc.com/product-detail/Multilayer-Ceramic-Capacitors-MLCC---SMD-SMT_HRE-HRE-CSA0603X5R226M6R3JT_C3015158.html
footprint CAP-0603 (0603 (1608M) Capacitor)
pins: 1, 2

## CSA0603X7R102K500JT
designator C?  Capacitance: 1nF  (hidden comment: *)
Capacitor, Ceramic (MLCC), 1nF, ±10%, 50V, X7R, ±10%, SMD 0603; Manufacturer: HRE; Manufacturer Part Number: CSA0603X7R102K500JT; Package Size: 0603; JLCPCB Basic Part: No; JLCPCB Part Number: C3012379; Supplier 1: LCSC; Category: Capacitors - MLCC; Supplier Part Number 1: C3012379; Tolerance: ±10%; Voltage Rating: 50V; Temperature Coefficient: X7R; RoHS: Yes; ComponentLink1Description: Datasheet; ComponentLink1URL: https://wmsc.lcsc.com/wmsc/upload/file/pdf/v2/lcsc/2206071716_HRE-CSA0603X7R102K500JT_C3012379.pdf; ComponentLink2Description: JLCPCB Part URL; ComponentLink2URL: https://jlcpcb.com/partdetail/C3012379; ComponentLink3Description: LCSC Part URL; ComponentLink3URL: https://lcsc.com/product-detail/Multilayer-Ceramic-Capacitors-MLCC---SMD-SMT_HRE-HRE-CSA0603X7R102K500JT_C3012379.html
footprint CAP-0603 (0603 (1608M) Capacitor)
pins: 1, 2

## CSA0603X7R103K500JT
designator C?  Capacitance: 10000pF  (hidden comment: *)
Capacitor, Ceramic (MLCC), 10000pF, ±10%, null, X7R, ±10%, SMD 0603; Manufacturer: HRE; Manufacturer Part Number: CSA0603X7R103K500JT; Package Size: 0603; JLCPCB Basic Part: No; JLCPCB Part Number: C3012380; Supplier 1: LCSC; Category: Capacitors - MLCC; Supplier Part Number 1: C3012380; Tolerance: ±10%; Voltage Rating: null; Temperature Coefficient: X7R; RoHS: Yes; ComponentLink1Description: Datasheet; ComponentLink1URL: https://wmsc.lcsc.com/wmsc/upload/file/pdf/v2/lcsc/2206071716_HRE-CSA0603X7R103K500JT_C3012380.pdf; ComponentLink2Description: JLCPCB Part URL; ComponentLink2URL: https://jlcpcb.com/partdetail/C3012380; ComponentLink3Description: LCSC Part URL; ComponentLink3URL: https://lcsc.com/product-detail/Multilayer-Ceramic-Capacitors-MLCC---SMD-SMT_HRE-HRE-CSA0603X7R103K500JT_C3012380.html
footprint CAP-0603 (0603 (1608M) Capacitor)
pins: 1, 2

## CSA0603X7R104K500JT
designator C?  Capacitance: 100nF  (hidden comment: *)
Capacitor, Ceramic (MLCC), 100nF, ±10%, 50V, X7R, ±10%, SMD 0603; Manufacturer: HRE; Manufacturer Part Number: CSA0603X7R104K500JT; Package Size: 0603; JLCPCB Basic Part: No; JLCPCB Part Number: C3012381; Supplier 1: LCSC; Category: Capacitors - MLCC; Supplier Part Number 1: C3012381; Tolerance: ±10%; Voltage Rating: 50V; Temperature Coefficient: X7R; RoHS: Yes; ComponentLink1Description: Datasheet; ComponentLink1URL: https://wmsc.lcsc.com/wmsc/upload/file/pdf/v2/lcsc/2206071716_HRE-CSA0603X7R104K500JT_C3012381.pdf; ComponentLink2Description: JLCPCB Part URL; ComponentLink2URL: https://jlcpcb.com/partdetail/C3012381; ComponentLink3Description: LCSC Part URL; ComponentLink3URL: https://lcsc.com/product-detail/Multilayer-Ceramic-Capacitors-MLCC---SMD-SMT_HRE-HRE-CSA0603X7R104K500JT_C3012381.html
footprint CAP-0603 (0603 (1608M) Capacitor)
pins: 1, 2

## CSA0603X7R223K500JT
designator C?  Capacitance: 22nF  (hidden comment: *)
Capacitor, Ceramic (MLCC), 22nF, ±10%, 50V, X7R, ±10%, SMD 0603; Manufacturer: HRE; Manufacturer Part Number: CSA0603X7R223K500JT; Package Size: 0603; JLCPCB Basic Part: No; JLCPCB Part Number: C3015135; Supplier 1: LCSC; Category: Capacitors - MLCC; Supplier Part Number 1: C3015135; Tolerance: ±10%; Voltage Rating: 50V; Temperature Coefficient: X7R; RoHS: Yes; ComponentLink1Description: Datasheet; ComponentLink1URL: https://wmsc.lcsc.com/wmsc/upload/file/pdf/v2/lcsc/2208051100_HRE-CSA0603X7R223K500JT_C3015135.pdf; ComponentLink2Description: JLCPCB Part URL; ComponentLink2URL: https://jlcpcb.com/partdetail/C3015135; ComponentLink3Description: LCSC Part URL; ComponentLink3URL: https://lcsc.com/product-detail/Multilayer-Ceramic-Capacitors-MLCC---SMD-SMT_HRE-HRE-CSA0603X7R223K500JT_C3015135.html
footprint CAP-0603 (0603 (1608M) Capacitor)
pins: 1, 2

## CSA0603X7R473K500JT
designator C?  Capacitance: 47nF  (hidden comment: *)
Capacitor, Ceramic (MLCC), 47nF, ±10%, 50V, X7R, ±10%, SMD 0603; Manufacturer: HRE; Manufacturer Part Number: CSA0603X7R473K500JT; Package Size: 0603; JLCPCB Basic Part: No; JLCPCB Part Number: C3015136; Supplier 1: LCSC; Category: Capacitors - MLCC; Supplier Part Number 1: C3015136; Tolerance: ±10%; Voltage Rating: 50V; Temperature Coefficient: X7R; RoHS: Yes; ComponentLink1Description: Datasheet; ComponentLink1URL: https://wmsc.lcsc.com/wmsc/upload/file/pdf/v2/lcsc/2208051100_HRE-CSA0603X7R473K500JT_C3015136.pdf; ComponentLink2Description: JLCPCB Part URL; ComponentLink2URL: https://jlcpcb.com/partdetail/C3015136; ComponentLink3Description: LCSC Part URL; ComponentLink3URL: https://lcsc.com/product-detail/Multilayer-Ceramic-Capacitors-MLCC---SMD-SMT_HRE-HRE-CSA0603X7R473K500JT_C3015136.html
footprint CAP-0603 (0603 (1608M) Capacitor)
pins: 1, 2

## CT41G-0603-2X1-50V-0_01_F-K_N_
designator C?  Capacitance: 10nF  (hidden comment: *)
Capacitor, Ceramic (MLCC), 10nF, ±10%, 50V, 2X1, ±10%, SMD 0603; Manufacturer: TORCH; Manufacturer Part Number: CT41G-0603-2X1-50V-0.01μF-K(N); Package Size: 0603; JLCPCB Basic Part: No; JLCPCB Part Number: C136131; Supplier 1: LCSC; Category: Capacitors - MLCC; Supplier Part Number 1: C136131; Tolerance: ±10%; Voltage Rating: 50V; Temperature Coefficient: 2X1; RoHS: Yes; ComponentLink1Description: Datasheet; ComponentLink1URL: https://wmsc.lcsc.com/wmsc/upload/file/pdf/v2/lcsc/1809291621_TORCH-CT41G-0603-2X1-50V-0-01-F-K-N_C136131.pdf; ComponentLink2Description: JLCPCB Part URL; ComponentLink2URL: https://jlcpcb.com/partdetail/C136131; ComponentLink3Description: LCSC Part URL; ComponentLink3URL: https://lcsc.com/product-detail/Multilayer-Ceramic-Capacitors-MLCC---SMD-SMT_TORCH-TORCH-CT41G-0603-2X1-50V-0.01%CE%BCF-KN_C136131.html
footprint CAP-0603 (0603 (1608M) Capacitor)
pins: 1, 2

## CX0603MRX7R9BB103
designator C?  Capacitance: 10nF  (hidden comment: *)
Capacitor, Ceramic (MLCC), 10nF, ±20%, 50V, X7R, ±20%, SMD 0603; Manufacturer: YAGEO; Manufacturer Part Number: CX0603MRX7R9BB103; Package Size: 0603; JLCPCB Basic Part: No; JLCPCB Part Number: C2178989; Supplier 1: LCSC; Category: Capacitors - MLCC; Supplier Part Number 1: C2178989; Tolerance: ±20%; Voltage Rating: 50V; Temperature Coefficient: X7R; RoHS: Yes; ComponentLink1Description: Datasheet; ComponentLink1URL: https://wmsc.lcsc.com/wmsc/upload/file/pdf/v2/lcsc/2202041030_YAGEO-CX0603MRX7R9BB103_C2178989.pdf; ComponentLink2Description: JLCPCB Part URL; ComponentLink2URL: https://jlcpcb.com/partdetail/C2178989; ComponentLink3Description: LCSC Part URL; ComponentLink3URL: https://lcsc.com/product-detail/Multilayer-Ceramic-Capacitors-MLCC---SMD-SMT_YAGEO-YAGEO-CX0603MRX7R9BB103_C2178989.html
footprint CAP-0603 (0603 (1608M) Capacitor)
pins: 1, 2

## EMK107ABJ225KAHT
designator C?  Capacitance: 2.2uF  (hidden comment: *)
Capacitor, Ceramic (MLCC), 2.2uF, ±10%, 16V, X5R, ±10%, SMD 0603; Manufacturer: Taiyo Yuden; Manufacturer Part Number: EMK107ABJ225KAHT; Package Size: 0603; JLCPCB Basic Part: No; JLCPCB Part Number: C385892; Supplier 1: LCSC; Category: Capacitors - MLCC; Supplier Part Number 1: C385892; Tolerance: ±10%; Voltage Rating: 16V; Temperature Coefficient: X5R; RoHS: Yes; ComponentLink1Description: Datasheet; ComponentLink1URL: https://wmsc.lcsc.com/wmsc/upload/file/pdf/v2/lcsc/2211282230_Taiyo-Yuden-EMK107ABJ225KAHT_C385892.pdf; ComponentLink2Description: JLCPCB Part URL; ComponentLink2URL: https://jlcpcb.com/partdetail/C385892; ComponentLink3Description: LCSC Part URL; ComponentLink3URL: https://lcsc.com/product-detail/Multilayer-Ceramic-Capacitors-MLCC---SMD-SMT_Taiyo-Yuden-Taiyo-Yuden-EMK107ABJ225KAHT_C385892.html
footprint CAP-0603 (0603 (1608M) Capacitor)
pins: 1, 2

## EMK107ABJ475KA-T
designator C?  Capacitance: 4.7uF  (hidden comment: *)
Capacitor, Ceramic (MLCC), 4.7uF, ±10%, 16V, X5R, ±10%, SMD 0603; Manufacturer: Taiyo Yuden; Manufacturer Part Number: EMK107ABJ475KA-T; Package Size: 0603; JLCPCB Basic Part: No; JLCPCB Part Number: C92758; Supplier 1: LCSC; Category: Capacitors - MLCC; Supplier Part Number 1: C92758; Tolerance: ±10%; Voltage Rating: 16V; Temperature Coefficient: X5R; RoHS: Yes; ComponentLink1Description: Datasheet; ComponentLink1URL: https://wmsc.lcsc.com/wmsc/upload/file/pdf/v2/lcsc/2312081721_Taiyo-Yuden-EMK107ABJ475KA-T_C92758.pdf; ComponentLink2Description: JLCPCB Part URL; ComponentLink2URL: https://jlcpcb.com/partdetail/C92758; ComponentLink3Description: LCSC Part URL; ComponentLink3URL: https://lcsc.com/product-detail/Multilayer-Ceramic-Capacitors-MLCC---SMD-SMT_Taiyo-Yuden-Taiyo-Yuden-EMK107ABJ475KA-T_C92758.html
footprint CAP-0603 (0603 (1608M) Capacitor)
pins: 1, 2

## EMK107B7104KAHT
designator C?  Capacitance: 100nF  (hidden comment: *)
Capacitor, Ceramic (MLCC), 100nF, ±10%, 16V, X7R, ±10%, SMD 0603; Manufacturer: Taiyo Yuden; Manufacturer Part Number: EMK107B7104KAHT; Package Size: 0603; JLCPCB Basic Part: No; JLCPCB Part Number: C2173920; Supplier 1: LCSC; Category: Capacitors - MLCC; Supplier Part Number 1: C2173920; Tolerance: ±10%; Voltage Rating: 16V; Temperature Coefficient: X7R; RoHS: Yes; ComponentLink1Description: Datasheet; ComponentLink1URL: https://wmsc.lcsc.com/wmsc/upload/file/pdf/v2/lcsc/2309051402_Taiyo-Yuden-EMK107B7104KAHT_C2173920.pdf; ComponentLink2Description: JLCPCB Part URL; ComponentLink2URL: https://jlcpcb.com/partdetail/C2173920; ComponentLink3Description: LCSC Part URL; ComponentLink3URL: https://lcsc.com/product-detail/Multilayer-Ceramic-Capacitors-MLCC---SMD-SMT_Taiyo-Yuden-Taiyo-Yuden-EMK107B7104KAHT_C2173920.html
footprint CAP-0603 (0603 (1608M) Capacitor)
pins: 1, 2

## EMK107B7105KA-T
designator C?  Capacitance: 1uF  (hidden comment: *)
Capacitor, Ceramic (MLCC), 1uF, ±10%, 16V, X7R, ±10%, SMD 0603; Manufacturer: Taiyo Yuden; Manufacturer Part Number: EMK107B7105KA-T; Package Size: 0603; JLCPCB Basic Part: No; JLCPCB Part Number: C92759; Supplier 1: LCSC; Category: Capacitors - MLCC; Supplier Part Number 1: C92759; Tolerance: ±10%; Voltage Rating: 16V; Temperature Coefficient: X7R; RoHS: Yes; ComponentLink1Description: Datasheet; ComponentLink1URL: https://wmsc.lcsc.com/wmsc/upload/file/pdf/v2/lcsc/1810091422_Taiyo-Yuden-EMK107B7105KA-T_C92759.pdf; ComponentLink2Description: JLCPCB Part URL; ComponentLink2URL: https://jlcpcb.com/partdetail/C92759; ComponentLink3Description: LCSC Part URL; ComponentLink3URL: https://lcsc.com/product-detail/Multilayer-Ceramic-Capacitors-MLCC---SMD-SMT_Taiyo-Yuden-Taiyo-Yuden-EMK107B7105KA-T_C92759.html
footprint CAP-0603 (0603 (1608M) Capacitor)
pins: 1, 2

## EMK107B7105KAHT
designator C?  Capacitance: 1uF  (hidden comment: *)
Capacitor, Ceramic (MLCC), 1uF, ±10%, 16V, X7R, ±10%, SMD 0603; Manufacturer: Taiyo Yuden; Manufacturer Part Number: EMK107B7105KAHT; Package Size: 0603; JLCPCB Basic Part: No; JLCPCB Part Number: C385893; Supplier 1: LCSC; Category: Capacitors - MLCC; Supplier Part Number 1: C385893; Tolerance: ±10%; Voltage Rating: 16V; Temperature Coefficient: X7R; RoHS: Yes; ComponentLink1Description: Datasheet; ComponentLink1URL: https://wmsc.lcsc.com/wmsc/upload/file/pdf/v2/lcsc/1912111437_Taiyo-Yuden-EMK107B7105KAHT_C385893.pdf; ComponentLink2Description: JLCPCB Part URL; ComponentLink2URL: https://jlcpcb.com/partdetail/C385893; ComponentLink3Description: LCSC Part URL; ComponentLink3URL: https://lcsc.com/product-detail/Multilayer-Ceramic-Capacitors-MLCC---SMD-SMT_Taiyo-Yuden-Taiyo-Yuden-EMK107B7105KAHT_C385893.html
footprint CAP-0603 (0603 (1608M) Capacitor)
pins: 1, 2

## EMK107B7224KAHT
designator C?  Capacitance: 220nF  (hidden comment: *)
Capacitor, Ceramic (MLCC), 220nF, ±10%, 16V, X7R, ±10%, SMD 0603; Manufacturer: Taiyo Yuden; Manufacturer Part Number: EMK107B7224KAHT; Package Size: 0603; JLCPCB Basic Part: No; JLCPCB Part Number: C650986; Supplier 1: LCSC; Category: Capacitors - MLCC; Supplier Part Number 1: C650986; Tolerance: ±10%; Voltage Rating: 16V; Temperature Coefficient: X7R; RoHS: Yes; ComponentLink1Description: Datasheet; ComponentLink1URL: https://wmsc.lcsc.com/wmsc/upload/file/pdf/v2/lcsc/2304140030_Taiyo-Yuden-EMK107B7224KAHT_C650986.pdf; ComponentLink2Description: JLCPCB Part URL; ComponentLink2URL: https://jlcpcb.com/partdetail/C650986; ComponentLink3Description: LCSC Part URL; ComponentLink3URL: https://lcsc.com/product-detail/Multilayer-Ceramic-Capacitors-MLCC---SMD-SMT_Taiyo-Yuden-Taiyo-Yuden-EMK107B7224KAHT_C650986.html
footprint CAP-0603 (0603 (1608M) Capacitor)
pins: 1, 2

## EMK107B7473KA-T
designator C?  Capacitance: 47nF  (hidden comment: *)
Capacitor, Ceramic (MLCC), 47nF, ±10%, 16V, X7R, ±10%, SMD 0603; Manufacturer: Taiyo Yuden; Manufacturer Part Number: EMK107B7473KA-T; Package Size: 0603; JLCPCB Basic Part: No; JLCPCB Part Number: C385894; Supplier 1: LCSC; Category: Capacitors - MLCC; Supplier Part Number 1: C385894; Tolerance: ±10%; Voltage Rating: 16V; Temperature Coefficient: X7R; RoHS: Yes; ComponentLink1Description: Datasheet; ComponentLink1URL: https://wmsc.lcsc.com/wmsc/upload/file/pdf/v2/lcsc/2304140030_Taiyo-Yuden-EMK107B7473KA-T_C385894.pdf; ComponentLink2Description: JLCPCB Part URL; ComponentLink2URL: https://jlcpcb.com/partdetail/C385894; ComponentLink3Description: LCSC Part URL; ComponentLink3URL: https://lcsc.com/product-detail/Multilayer-Ceramic-Capacitors-MLCC---SMD-SMT_Taiyo-Yuden-Taiyo-Yuden-EMK107B7473KA-T_C385894.html
footprint CAP-0603 (0603 (1608M) Capacitor)
pins: 1, 2